# Altium schematic symbol library IC_ADI.SCHLIB: 3169 symbols (part 3 of 181)
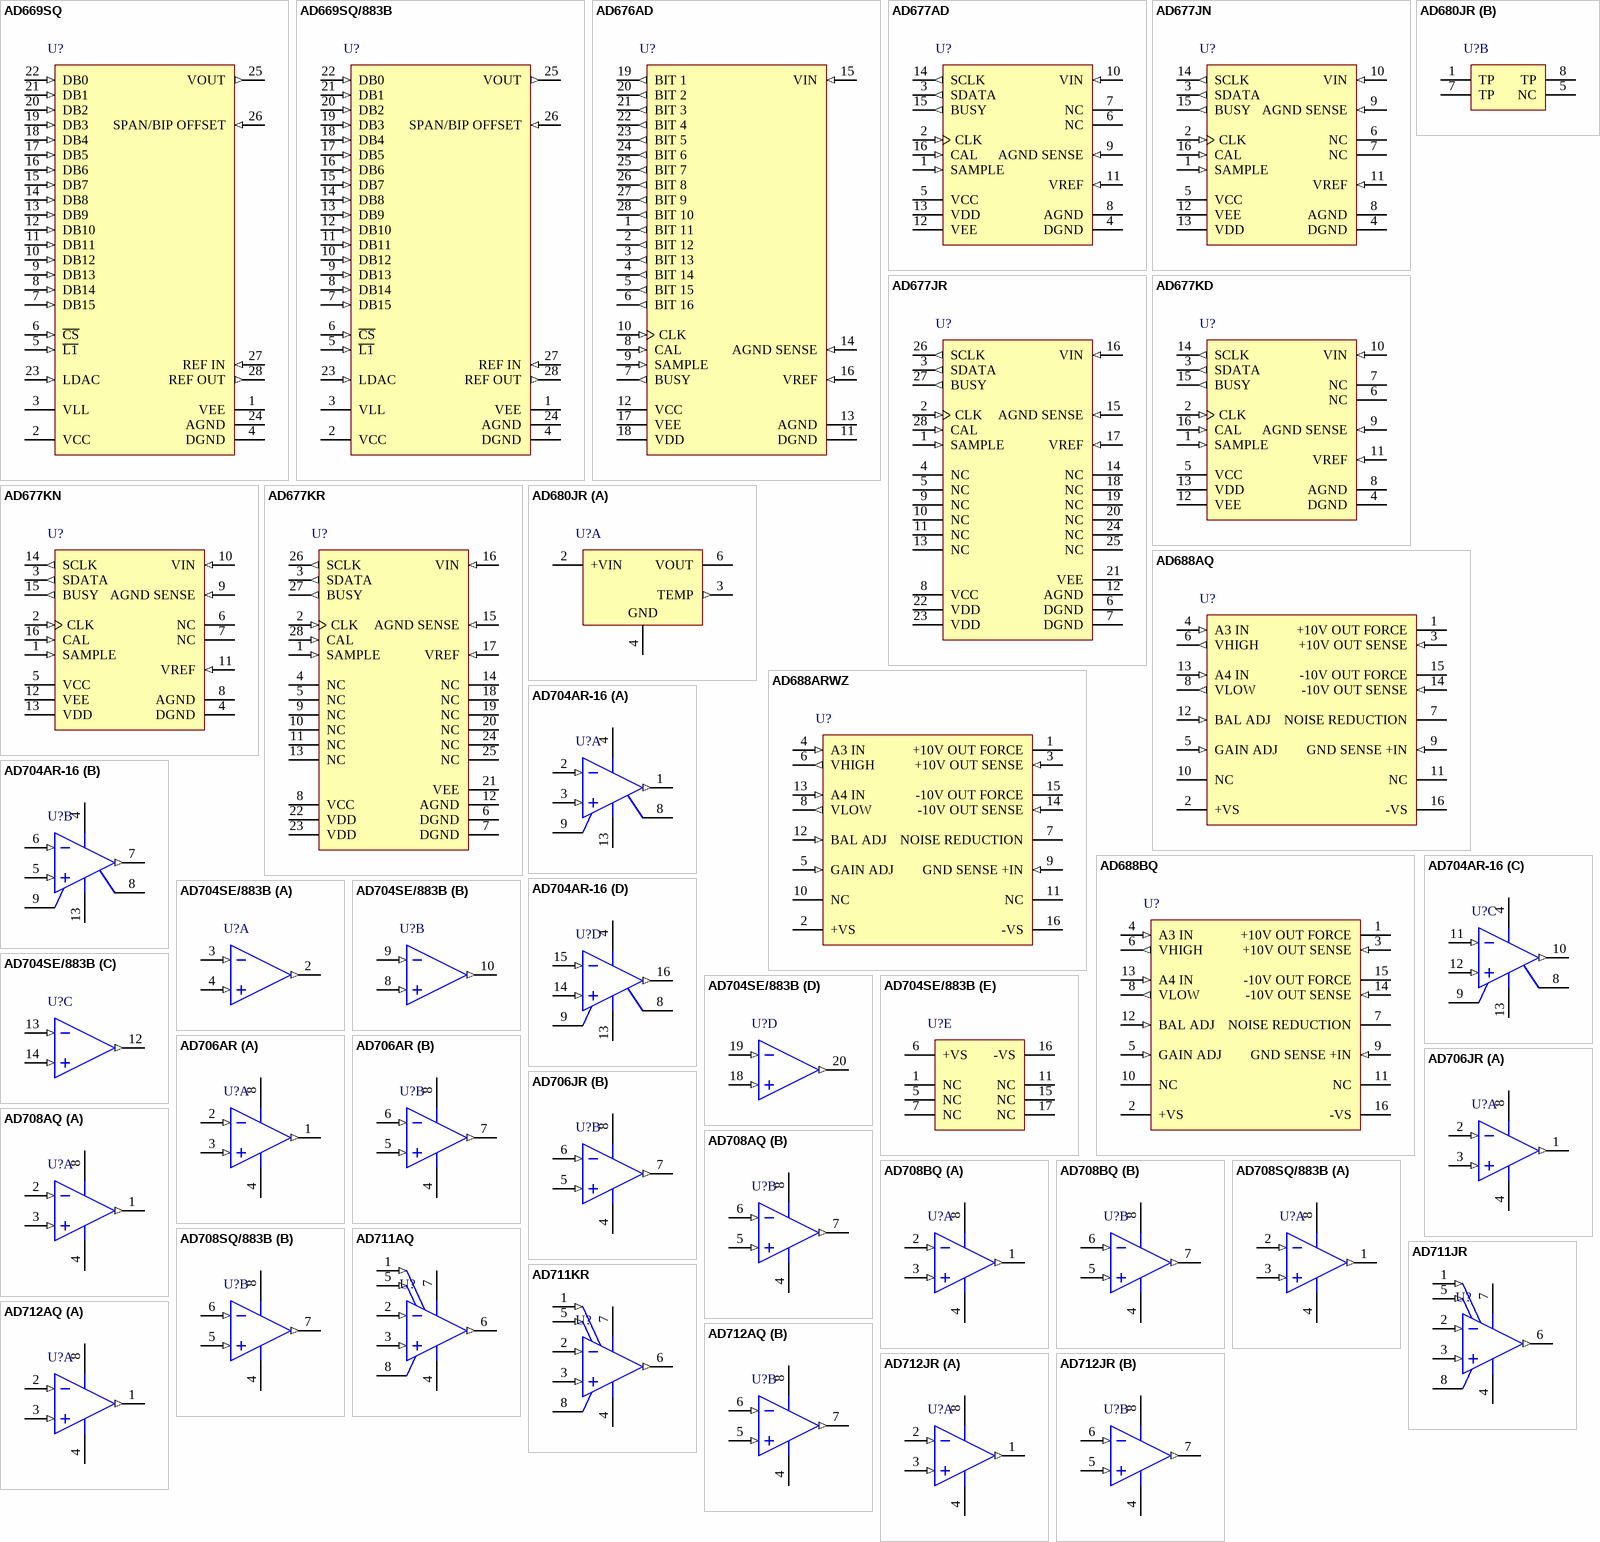
[diagram p193: symbols AD669SQ to AD712JR]

## AD677JR
designator U?
Single 16-Bit Sampling Analog-to-Digital Converter with Serial Interface, 100KSPS, 0 to +70 degC, RW-28, Tube; Generic Part Number: AD677; PartNumber: AD677JR; Resolution (Bits): 16; Channels: 1; Throughput Rate (SPS): 100K; Interface: Ser; DatasheetVersion: Rev.A; PackageVersion: 060706-A; PackageReference: RW-28; PackageDescription: 28-Lead Standard Small Outline Package [SOIC_W]; Supplier Part Number 1: AD677JR-ND; Supplier Part Number 2: 584-AD677JR; RoHS: N; Packing: Tube; Mounting Technology: Surface Mount; Code_JEDEC: MS-013-AE; ComponentLink1Description: Manufacturer URL; ComponentLink2Description: Datasheet; ComponentLink3Description: Package Specification; ComponentLink4Description: Product URL
footprint SOIC28W_1.27 (Footprint not found)
pins: 1 SAMPLE (in) "VIN Acquisition Control Pin. Active HIGH. During conversion, SAMPLEcontrols the suite of the internal sample-hold amplifier and the falling edgeinitiates conversion. During calibration, SAMPLE should be held LOW. IfHIGH (See Datasheet)", 2 CLK (in) "Master Clock Input. The AD677 requires 17 clock pulses to execute a conversion. CLK is also used to derive SCLK.", 3 SDATA (out) "Serial Output Data Controlled by SCLK.", 4 NC "No Connection. No connections should be made to these pins.", 5 NC "No Connection. No connections should be made to these pins.", 6 DGND (power) "Digital Ground.", 7 DGND (power) "Digital Ground.", 8 VCC (power) "+12 V Analog Supply Voltage.", 9 NC "No Connection. No connections should be made to these pins.", 10 NC "No Connection. No connections should be made to these pins.", 11 NC "No Connection. No connections should be made to these pins.", 12 AGND (power) "Analog Ground.", 13 NC "No Connection. No connections should be made to these pins.", 14 NC "No Connection. No connections should be made to these pins.", 15 AGND SENSE (in) "Analog Ground Sense.", 16 VIN (in) "Analog Input Voltage", 17 VREF (in) "External Voltage Reference Input.", 18 NC "No Connection. No connections should be made to these pins.", 19 NC "No Connection. No connections should be made to these pins.", 20 NC "No Connection. No connections should be made to these pins.", 21 VEE (power) "-12 V Analog Supply Voltage.", 22 VDD (power) "+5 V Logic Supply Voltage.", 23 VDD (power) "+5 V Logic Supply Voltage.", 24 NC "No Connection. No connections should be made to these pins.", 25 NC "No Connection. No connections should be made to these pins.", 26 SCLK (out) "Clock Output for Data Read, derived from CLK.", 27 BUSY (out) "Status Line for Converter. Active HIGH, indicating a conversion or calibration in progress.", 28 CAL (in) "Calibration Control Pin."

## AD677KD
designator U?
Single 16-Bit Sampling Analog-to-Digital Converter with Serial Interface, 100KSPS, 0 to +70 degC, D-16, Tube; Generic Part Number: AD677; PartNumber: AD677KD; Resolution (Bits): 16; Channels: 1; Throughput Rate (SPS): 100K; Interface: Ser; DatasheetVersion: Rev.A; PackageVersion: Oct-2004; PackageReference: D-16; PackageDescription: 16-Lead Side-Brazed Ceramic Dual In-Line Package [SBDIP]; Supplier Part Number 1: AD677KD-ND; Supplier Part Number 2: 584-AD677KD; RoHS: N; Packing: Tube; Mounting Technology: Through-hole; ComponentLink1Description: Manufacturer URL; ComponentLink2Description: Datasheet; ComponentLink3Description: Package Specification; ComponentLink4Description: Product URL
footprint DIP16 (Footprint not found)
pins: 1 SAMPLE (in) "VIN Acquisition Control Pin. Active HIGH. During conversion, SAMPLE controls the suite of the internal sample-hold amplifier and the falling edge initiates conversion. During calibration, SAMPLE should be held LOW. If HIGH (See Datasheet)", 2 CLK (in) "Master Clock Input. The AD677 requires 17 clock pulses to execute a conversion. CLK is also used to derive SCLK.", 3 SDATA (out) "Serial Output Data Controlled by SCLK.", 4 DGND (power) "Digital Ground.", 5 VCC (power) "+12 V Analog Supply Voltage.", 6 NC "No Connection. No connections should be made to these pins.", 7 NC "No Connection. No connections should be made to these pins.", 8 AGND (power) "Analog Ground.", 9 AGND SENSE (in) "Analog Ground Sense.", 10 VIN (in) "Analog Input Voltage.", 11 VREF (in) "External Voltage Reference Input.", 12 VEE (power) "-12 V Analog Supply Voltage.", 13 VDD (power) "+5 V Logic Supply Voltage.", 14 SCLK (out) "Clock Output for Data Read, derived from CLK.", 15 BUSY (out) "Status Line for Converter. Active HIGH, indicating a conversion or calibration in progress.", 16 CAL (in) "Calibration Control Pin."

## AD677KN
designator U?
Single 16-Bit Sampling Analog-to-Digital Converter with Serial Interface, 100KSPS, 0 to +70 degC, N-16, Tube; Generic Part Number: AD677; PartNumber: AD677KN; Resolution (Bits): 16; Channels: 1; Throughput Rate (SPS): 100K; Interface: Ser; DatasheetVersion: Rev.A; PackageVersion: 070706-A; PackageReference: N-16; PackageDescription: 16-Lead Plastic Dual In-Line Package [PDIP] Narrow Body; Supplier Part Number 1: AD677KN-ND; Supplier Part Number 2: 584-AD677KN; RoHS: N; Packing: Tube; Mounting Technology: Through-hole; Code_JEDEC: MS-001; ComponentLink1Description: Manufacturer URL; ComponentLink2Description: Datasheet; ComponentLink3Description: Package Specification; ComponentLink4Description: Product URL
footprint DIP16 (Footprint not found)
pins: 1 SAMPLE (in) "VIN  Acquisition Control Pin. Active HIGH. During conversion, SAMPLE controls the suite of the internal sample-hold amplifier and the falling edge initiates conversion. During calibration, SAMPLE should be held LOW. If HIGH (See Datasheet)", 2 CLK (in) "Master Clock Input. The AD677 requires 17 clock pulses to execute a conversion. CLK is also used to derive SCLK.", 3 SDATA (out) "Serial Output Data Controlled by SCLK.", 4 DGND (power) "Digital Ground.", 5 VCC (power) "+12 V Analog Supply Voltage.", 6 NC "No Connection. No connections should be made to these pins.", 7 NC "No Connection. No connections should be made to these pins.", 8 AGND (power) "Analog Ground.", 9 AGND SENSE (in) "Analog Ground Sense.", 10 VIN (in) "Analog Input Voltage.", 11 VREF (in) "External Voltage Reference Input.", 12 VEE (power) "-12 V Analog Supply Voltage.", 13 VDD (power) "+5 V Logic Supply Voltage.", 14 SCLK (out) "Clock Output for Data Read, derived from CLK.", 15 BUSY (out) "Status Line for Converter. Active HIGH, indicating a conversion or calibration in progress.", 16 CAL (in) "Calibration Control Pin."

## AD677KR
designator U?
Single 16-Bit Sampling Analog-to-Digital Converter with Serial Interface, 100KSPS, 0 to +70 degC, RW-28, Tube; Generic Part Number: AD677; PartNumber: AD677KR; Resolution (Bits): 16; Channels: 1; Throughput Rate (SPS): 100K; Interface: Ser; DatasheetVersion: Rev.A; PackageVersion: 060706-A; PackageReference: RW-28; PackageDescription: 28-Lead Standard Small Outline Package [SOIC_W]; Supplier Part Number 1: AD677KR-ND; Supplier Part Number 2: 584-AD677KR; RoHS: N; Packing: Tube; Mounting Technology: Surface Mount; Code_JEDEC: MS-013-AE; ComponentLink1Description: Manufacturer URL; ComponentLink2Description: Datasheet; ComponentLink3Description: Package Specification; ComponentLink4Description: Product URL
footprint SOIC28W_1.27 (Footprint not found)
pins: 1 SAMPLE (in) "VIN Acquisition Control Pin. Active HIGH. During conversion, SAMPLEcontrols the suite of the internal sample-hold amplifier and the falling edgeinitiates conversion. During calibration, SAMPLE should be held LOW. IfHIGH (See Datasheet)", 2 CLK (in) "Master Clock Input. The AD677 requires 17 clock pulses to execute a conversion. CLK is also used to derive SCLK.", 3 SDATA (out) "Serial Output Data Controlled by SCLK.", 4 NC "No Connection. No connections should be made to these pins.", 5 NC "No Connection. No connections should be made to these pins.", 6 DGND (power) "Digital Ground.", 7 DGND (power) "Digital Ground.", 8 VCC (power) "+12 V Analog Supply Voltage.", 9 NC "No Connection. No connections should be made to these pins.", 10 NC "No Connection. No connections should be made to these pins.", 11 NC "No Connection. No connections should be made to these pins.", 12 AGND (power) "Analog Ground.", 13 NC "No Connection. No connections should be made to these pins.", 14 NC "No Connection. No connections should be made to these pins.", 15 AGND SENSE (in) "Analog Ground Sense.", 16 VIN (in) "Analog Input Voltage", 17 VREF (in) "External Voltage Reference Input.", 18 NC "No Connection. No connections should be made to these pins.", 19 NC "No Connection. No connections should be made to these pins.", 20 NC "No Connection. No connections should be made to these pins.", 21 VEE (power) "-12 V Analog Supply Voltage.", 22 VDD (power) "+5 V Logic Supply Voltage.", 23 VDD (power) "+5 V Logic Supply Voltage.", 24 NC "No Connection. No connections should be made to these pins.", 25 NC "No Connection. No connections should be made to these pins.", 26 SCLK (out) "Clock Output for Data Read, derived from CLK.", 27 BUSY (out) "Status Line for Converter. Active HIGH, indicating a conversion or calibration in progress.", 28 CAL (in) "Calibration Control Pin."

## AD680JR
designator U?
Low Power, Low Cost Reference, 2.5 V Output, 4.5 to 36 V Supply, Commercial, 8-pin SOIC (R-8), Tube; PartNumber: AD680JR; Max V Supply (V): 36; Min V Supply (V): 4.5; Ref Out TC (ppm/C): 10; Vout: 2.5V; DatasheetVersion: Rev. H; PackageVersion: 060506-A, 06/2006; PackageReference: R-8; PackageDescription: 8-Pin Standard Small Outline Package, Body 4.9 x 3.9 mm, Pitch 1.27 mm; Supplier Part Number 1: AD680JR-ND; Supplier Part Number 2: 1017960; Supplier Part Number 3: N/A; Packing: Tube; Operating Temp Range: 0 to 70 degC; Mounting Technology: Surface Mount; Code_JEDEC: MS-012-AA; ComponentLink1Description: Manufacturer URL; ComponentLink2Description: Datasheet; ComponentLink3Description: Package Specification; ComponentLink4Description: URL Link1
footprint SOIC8_1.27 (Footprint not found)
part A pins: 2 +VIN (power) "Input Voltage.", 3 TEMP (out) "Temperature Output.", 4 GND (power) "Ground.", 6 VOUT (power) "Output Voltage."
part B pins: 1 TP "Test Point. A factory test point. No connections are made to these pins.", 5 NC "No Connect.", 7 TP "Test Point. A factory test point. No connections are made to these pins.", 8 TP "Test Point. A factory test point. No connections are made to these pins."

## AD688AQ
designator U?
High Precision Reference, 10 V Output, + / - 15 V Supply, Industrial, 16-pin DIP (Q-16), Tube; PartNumber: AD688AQ; Ref Out TC (ppm/C): 3; Vout: +/-10V; DatasheetVersion: Rev. B; PackageVersion: Aug-05; PackageReference: Q-16; PackageDescription: 16-Pin Ceramic Dual In-Line Package, Row spacing 7.62 mm, Pitch 2.54 mm; Supplier Part Number 1: AD688AQ-ND; Supplier Part Number 2: 2190205; Supplier Part Number 3: 584-AD688AQ; Packing: Tube; Operating Temp Range: -40 to 85 degC; Mounting Technology: Through Hole; ComponentLink1Description: Manufacturer URL; ComponentLink2Description: Datasheet; ComponentLink3Description: Package Specification; ComponentLink4Description: URL Link1
footprint DIP16 (Footprint not found)
pins: 1 +10V OUT FORCE (power) "+10 V Output with Kelvin Force. Connect to Pin 3.", 2 +VS (power) "Positive Power Supply.", 3 +10V OUT SENSE (in) "+10 V Output with Kelvin Sense. Connect to Pin 1.", 4 A3 IN (in) "+ Input to A3. Connect to VHIGH, Pin 6.", 5 GAIN ADJ (in) "Reference Gain Adjustment for Calibration. See the Calibration section.", 6 VHIGH (out) "Unbuffered Reference High Output.", 7 NOISE REDUCTION "Noise Filtering Pin. Connect external 1 uF capacitor to ground to reduce output noise, see the Noise Performance and Reduction section. May be left open.", 8 VLOW (out) "Unbuffered Reference Low Output.", 9 GND SENSE +IN (in) "Gound with Kelvin Sense.", 10 NC "No Connection. Leave floating.", 11 NC "No Connection. Leave floating.", 12 BAL ADJ (in) "Reference Centering Adjustment for Calibration. See the Calibration section.", 13 A4 IN (in) "+ Input to A4. Connect to VLOW, Pin 8.", 14 -10V OUT SENSE (in) "-10 V Output with Kelvin Sense. Connect to Pin 15.", 15 -10V OUT FORCE (power) "-10 V Output with Kelvin Force. Connect to Pin 14.", 16 -VS (power) "Negative Power Supply."

## AD688ARWZ
designator U?
High Precision Reference, 10 V Output, + / - 15 V Supply, Industrial, 16-pin SOIC (RW-16), Tube; PartNumber: AD688ARWZ; Ref Out TC (ppm/C): 8; Vout: +/-10V; DatasheetVersion: Rev. B; PackageVersion: 032707-B, 03/2007; PackageReference: RW-16; PackageDescription: 16-Pin Standard Small Outline Package, Body 10.3 x 7.5 mm, Pitch 1.27 mm; Supplier Part Number 1: AD688ARWZ-ND; Supplier Part Number 2: 1838918; Supplier Part Number 3: 584-AD688ARWZ; Packing: Tube; Operating Temp Range: -40 to 85 degC; Mounting Technology: Surface Mount; Code_JEDEC: MS-013-AA; ComponentLink1Description: Manufacturer URL; ComponentLink2Description: Datasheet; ComponentLink3Description: Package Specification; ComponentLink4Description: URL Link1
footprint SOIC16W_1.27 (Footprint not found)
pins: 1 +10V OUT FORCE (power) "+10 V Output with Kelvin Force. Connect to Pin 3.", 2 +VS (power) "Positive Power Supply.", 3 +10V OUT SENSE (in) "+10 V Output with Kelvin Sense. Connect to Pin 1.", 4 A3 IN (in) "+ Input to A3. Connect to VHIGH, Pin 6.", 5 GAIN ADJ (in) "Reference Gain Adjustment for Calibration. See the Calibration section.", 6 VHIGH (out) "Unbuffered Reference High Output.", 7 NOISE REDUCTION "Noise Filtering Pin. Connect external 1 uF capacitor to ground to reduce output noise, see the Noise Performance and Reduction section. May be left open.", 8 VLOW (out) "Unbuffered Reference Low Output.", 9 GND SENSE +IN (in) "Gound with Kelvin Sense.", 10 NC "No Connection. Leave floating.", 11 NC "No Connection. Leave floating.", 12 BAL ADJ (in) "Reference Centering Adjustment for Calibration. See the Calibration section.", 13 A4 IN (in) "+ Input to A4. Connect to VLOW, Pin 8.", 14 -10V OUT SENSE (in) "-10 V Output with Kelvin Sense. Connect to Pin 15.", 15 -10V OUT FORCE (power) "-10 V Output with Kelvin Force. Connect to Pin 14.", 16 -VS (power) "Negative Power Supply."

## AD688BQ
designator U?
High Precision Reference, 10 V Output, + / - 15 V Supply, Industrial, 16-pin DIP (Q-16), Tube; PartNumber: AD688BQ; Ref Out TC (ppm/C): 3; Vout: +/-10V; DatasheetVersion: Rev. B; PackageVersion: Aug-05; PackageReference: Q-16; PackageDescription: 16-Pin Ceramic Dual In-Line Package, Row spacing 7.62 mm, Pitch 2.54 mm; Supplier Part Number 1: AD688BQ-ND; Supplier Part Number 2: 584-AD688BQ; Packing: Tube; Operating Temp Range: -40 to 85 degC; Mounting Technology: Through Hole; ComponentLink1Description: Manufacturer URL; ComponentLink2Description: Datasheet; ComponentLink3Description: Package Specification; ComponentLink4Description: URL Link1
footprint DIP16 (Footprint not found)
pins: 1 +10V OUT FORCE (power) "+10 V Output with Kelvin Force. Connect to Pin 3.", 2 +VS (power) "Positive Power Supply.", 3 +10V OUT SENSE (in) "+10 V Output with Kelvin Sense. Connect to Pin 1.", 4 A3 IN (in) "+ Input to A3. Connect to VHIGH, Pin 6.", 5 GAIN ADJ (in) "Reference Gain Adjustment for Calibration. See the Calibration section.", 6 VHIGH (out) "Unbuffered Reference High Output.", 7 NOISE REDUCTION "Noise Filtering Pin. Connect external 1 uF capacitor to ground to reduce output noise, see the Noise Performance and Reduction section. May be left open.", 8 VLOW (out) "Unbuffered Reference Low Output.", 9 GND SENSE +IN (in) "Gound with Kelvin Sense.", 10 NC "No Connection. Leave floating.", 11 NC "No Connection. Leave floating.", 12 BAL ADJ (in) "Reference Centering Adjustment for Calibration. See the Calibration section.", 13 A4 IN (in) "+ Input to A4. Connect to VLOW, Pin 8.", 14 -10V OUT SENSE (in) "-10 V Output with Kelvin Sense. Connect to Pin 15.", 15 -10V OUT FORCE (power) "-10 V Output with Kelvin Force. Connect to Pin 14.", 16 -VS (power) "Negative Power Supply."

## AD704AR-16
designator U?
Quad Channel Low Power Operational Amplifier, 800 KHz BW, 150 mV/us SR, Industrial, 16-pin SOIC (RW-16), Tube; Generic Part Number: AD704; PartNumber: AD704AR-16; Amplifiers Per Package: 4; Input Bias Current: 100pA; Input Offset Voltage: 30uV; Iq/Amp: 600uA; Small Signal Bandwidth: 800KHz; V Span Max: 36V; V Span Min: 4V; DatasheetVersion: Rev. E; PackageVersion: 032707-B; PackageReference: RW-16; PackageDescription: 16-Pin Standard Small Outline Package, Body 10.3 x 7.5 mm, Pitch 1.27 mm; Supplier Part Number 1: AD704AR-16-ND; Supplier Part Number 2: 66F5820; Packing: Tube; Slew Rate: 150mV/us; Mounting Technology: Surface Mount; Code_JEDEC: MS-013-AA; ComponentLink1Description: Manufacturer URL; ComponentLink2Description: Datasheet; ComponentLink3Description: Package Specification
footprint SOIC16W_1.27 (Footprint not found)
pins on every part: 4 +VS (power), 8 NC, 9 NC, 13 -VS (power)
part A pins: 1 OUT 1 (out), 2 -IN 1 (in), 3 +IN 1 (in)
part B pins: 5 +IN 2 (in), 6 -IN 2 (in), 7 OUT 2 (out)
part C pins: 10 OUT 3 (out), 11 -IN 3 (in), 12 +IN 3 (in)
part D pins: 14 +IN 4 (in), 15 -IN 4 (in), 16 OUT 4 (out)

## AD704SE/883B
designator U?
Quad Channel Low Power Operational Amplifier, 800 KHz BW, 150 mV/us SR, Military, 20-pin LCC (E-20-1), Tube; Generic Part Number: AD704; PartNumber: AD704SE/883B; Amplifiers Per Package: 4; Input Bias Current: 100pA; Input Offset Voltage: 30uV; Iq/Amp: 600uA; Small Signal Bandwidth: 800KHz; V Span Max: 36V; V Span Min: 4V; DatasheetVersion: Rev. E; PackageVersion: 022106-A; PackageReference: E-20-1; PackageDescription: 20-Terminal Ceramic Leadless Chip Carrier, Body 8.89 x 8.89 mm, Pitch 1.27 mm; Supplier Part Number 1: AD704SE/883B-ND; Packing: Tube; Slew Rate: 150mV/us; Mounting Technology: Surface Mount; ComponentLink1Description: Manufacturer URL; ComponentLink2Description: Datasheet; ComponentLink3Description: Package Specification
footprint PLCC-20N (Footprint not found)
part A pins: 2 OUT 1 (out), 3 -IN 1 (in), 4 +IN 1 (in)
part B pins: 8 +IN 2 (in), 9 -IN 2 (in), 10 OUT 2 (out)
part C pins: 12 OUT 3 (out), 13 -IN 3 (in), 14 +IN 3 (in)
part D pins: 18 +IN 4 (in), 19 -IN 4 (in), 20 OUT 4 (out)
part E pins: 1 NC, 5 NC, 6 +VS (power), 7 NC, 11 NC, 15 NC, 16 -VS (power), 17 NC

## AD706AR
designator U?
Double Channel High DC Precision Operational Amplifier, 800 KHz BW, 150 mV/us SR, Industrial, 8-pin SOIC (R-8), Tube; Generic Part Number: AD706; PartNumber: AD706AR; Amplifiers Per Package: 2; Input Bias Current: 50pA; Input Offset Voltage: 30uV; Iq/Amp: 600uA; Small Signal Bandwidth: 800KHz; V Span Max: 36V; V Span Min: 4V; DatasheetVersion: Rev. E; PackageVersion: 060506-A; PackageReference: R-8; PackageDescription: 8-Pin Standard Small Outline Package, Body 3.9 x 4.9 mm, Pitch 1.27 mm; Supplier Part Number 1: AD706AR-ND; Packing: Tube; Slew Rate: 150mV/us; Mounting Technology: Surface Mount; Code_JEDEC: MS-012-AA; ComponentLink1Description: Manufacturer URL; ComponentLink2Description: Datasheet; ComponentLink3Description: Package Specification
footprint SOIC8_1.27 (Footprint not found)
pins on every part: 4 -V (power), 8 +V (power)
part A pins: 1 OUT (out), 2 -IN (in), 3 +IN (in)
part B pins: 5 +IN (in), 6 -IN (in), 7 OUT (out)

## AD706JR
designator U?
Double Channel High DC Precision Operational Amplifier, 800 KHz BW, 150 mV/us SR, Commercial, 8-pin SOIC (R-8), Tube; Generic Part Number: AD706; PartNumber: AD706JR; Amplifiers Per Package: 2; Input Bias Current: 50pA; Input Offset Voltage: 30uV; Iq/Amp: 600uA; Small Signal Bandwidth: 800KHz; V Span Max: 36V; V Span Min: 4V; DatasheetVersion: Rev. E; PackageVersion: 060506-A; PackageReference: R-8; PackageDescription: 8-Pin Standard Small Outline Package, Body 3.9 x 4.9 mm, Pitch 1.27 mm; Supplier Part Number 1: AD706JR-ND; Packing: Tube; Slew Rate: 150mV/us; Mounting Technology: Surface Mount; Code_JEDEC: MS-012-AA; ComponentLink1Description: Manufacturer URL; ComponentLink2Description: Datasheet; ComponentLink3Description: Package Specification
footprint SOIC8_1.27 (Footprint not found)
pins on every part: 4 -V (power), 8 +V (power)
part A pins: 1 OUT (out), 2 -IN (in), 3 +IN (in)
part B pins: 5 +IN (in), 6 -IN (in), 7 OUT (out)

## AD708AQ
designator U?
Double Channel Very High DC Precision Operational Amplifier, 900KHz BW, 300 mV/us SR, Industrial, 8-pin DIP (Q-8), Tube; Generic Part Number: AD708; PartNumber: AD708AQ; Amplifiers Per Package: 2; Input Bias Current: 1nA; Input Offset Voltage: 30uV; Iq/Amp: 2.75mA; V Span Max: 36V; V Span Min: 6V; DatasheetVersion: Rev. C; PackageReference: Q-8; PackageDescription: 8-Pin Ceramic Dual In-Line Package, Row spacing 7.62 mm, Pitch 2.54 mm; Supplier Part Number 1: AD708AQ-ND; Supplier Part Number 2: 2231864; Supplier Part Number 3: 05F7250; Packing: Tube; Slew Rate: 300mV/us; Small Signal Bandwidth: 900KHz; Mounting Technology: Through Hole; ComponentLink1Description: Manufacturer URL; ComponentLink2Description: Datasheet; ComponentLink3Description: Package Specification
footprint DIP8 (Footprint not found)
pins on every part: 4 -VS (power), 8 +VS (power)
part A pins: 1 OUT A (out), 2 -IN A (in), 3 +IN A (in)
part B pins: 5 +IN B (in), 6 -IN B (in), 7 OUT B (out)

## AD708BQ
designator U?
Double Channel Very High DC Precision Operational Amplifier, 900KHz BW, 300 mV/us SR, Industrial, 8-pin DIP (Q-8), Tube; Generic Part Number: AD708; PartNumber: AD708BQ; Amplifiers Per Package: 2; Input Bias Current: 0.5nA; Input Offset Voltage: 5uV; Iq/Amp: 2.75mA; V Span Max: 36V; V Span Min: 6V; DatasheetVersion: Rev. C; PackageReference: Q-8; PackageDescription: 8-Pin Ceramic Dual In-Line Package, Row spacing 7.62 mm, Pitch 2.54 mm; Supplier Part Number 1: AD708BQ-ND; Supplier Part Number 2: 05F7251; Packing: Tube; Slew Rate: 300mV/us; Small Signal Bandwidth: 900KHz; Mounting Technology: Through Hole; ComponentLink1Description: Manufacturer URL; ComponentLink2Description: Datasheet; ComponentLink3Description: Package Specification
footprint DIP8 (Footprint not found)
pins on every part: 4 -VS (power), 8 +VS (power)
part A pins: 1 OUT A (out), 2 -IN A (in), 3 +IN A (in)
part B pins: 5 +IN B (in), 6 -IN B (in), 7 OUT B (out)

## AD708SQ/883B
designator U?
Double Channel Very High DC Precision Operational Amplifier, 900KHz BW, 300 mV/us SR, Military, 8-pin DIP (Q-8), Tube; Generic Part Number: AD708; PartNumber: AD708SQ/883B; Amplifiers Per Package: 2; Input Bias Current: 0.5nA; Input Offset Voltage: 5uV; Iq/Amp: 2.75mA; V Span Max: 36V; V Span Min: 6V; DatasheetVersion: Rev. C; PackageReference: Q-8; PackageDescription: 8-Pin Ceramic Dual In-Line Package, Row spacing 7.62 mm, Pitch 2.54 mm; Supplier Part Number 1: AD708SQ/883B-ND; Packing: Tube; Slew Rate: 300mV/us; Small Signal Bandwidth: 900KHz; Mounting Technology: Through Hole; ComponentLink1Description: Manufacturer URL; ComponentLink2Description: Datasheet; ComponentLink3Description: Package Specification
footprint DIP8 (Footprint not found)
pins on every part: 4 -VS (power), 8 +VS (power)
part A pins: 1 OUT A (out), 2 -IN A (in), 3 +IN A (in)
part B pins: 5 +IN B (in), 6 -IN B (in), 7 OUT B (out)

## AD711AQ
designator U?
Single Channel Operational Amplifier, 4 MHz BW, 20 V/us SR, Industrial, 8-pin DIP (Q-8), Tube; Generic Part Number: AD711; PartNumber: AD711AQ; Amplifiers Per Package: 1; Input Bias Current: 15pA; Input Offset Voltage: 300uV; Iq/Amp: 2.8mA; Slew Rate: 20V/us; Small Signal Bandwidth: 4MHz; V Span Max: 36V; V Span Min: 9V; DatasheetVersion: Rev. E; PackageReference: Q-8; PackageDescription: 8-Pin Ceramic Dual In-Line Package, Row spacing 7.62 mm, Pitch 2.54 mm; Supplier Part Number 1: AD711AQ-ND; Supplier Part Number 2: 05F7255; Packing: Tube; Mounting Technology: Through Hole; ComponentLink1Description: Manufacturer URL; ComponentLink2Description: Datasheet; ComponentLink3Description: Package Specification
footprint DIP8 (Footprint not found)
pins: 1 OFFSET NULL (in), 2 INVERTING INPUT (in), 3 NONINVERTING INPUT (in), 4 -VS (power), 5 OFFSET NULL (in), 6 OUT (out), 7 +VS (power), 8 NC

## AD711JR
designator U?
Single Channel Operational Amplifier, 4 MHz BW, 20 V/us SR, Commercial, 8-pin SOIC (R-8), Tube; Generic Part Number: AD711; PartNumber: AD711JR; Amplifiers Per Package: 1; Input Bias Current: 15pA; Input Offset Voltage: 300uV; Iq/Amp: 2.8mA; Slew Rate: 20V/us; Small Signal Bandwidth: 4MHz; V Span Max: 36V; V Span Min: 9V; DatasheetVersion: Rev. E; PackageVersion: 060506-A; PackageReference: R-8; PackageDescription: 8-Pin Standard Small Outline Package, Body 3.9 x 4.9 mm, Pitch 1.27 mm; Supplier Part Number 1: AD711JR-ND; Packing: Tube; Mounting Technology: Surface Mount; Code_JEDEC: MS-012-AA; ComponentLink1Description: Manufacturer URL; ComponentLink2Description: Datasheet; ComponentLink3Description: Package Specification
footprint SOIC8_1.27 (Footprint not found)
pins: 1 OFFSET NULL (in), 2 INVERTING INPUT (in), 3 NONINVERTING INPUT (in), 4 -VS (power), 5 OFFSET NULL (in), 6 OUT (out), 7 +VS (power), 8 NC

## AD711KR
designator U?
Single Channel Operational Amplifier, 4 MHz BW, 20 V/us SR, Commercial, 8-pin SOIC (R-8), Tube; Generic Part Number: AD711; PartNumber: AD711KR; Amplifiers Per Package: 1; Input Bias Current: 15pA; Input Offset Voltage: 200uV; Iq/Amp: 2.8mA; Slew Rate: 20V/us; Small Signal Bandwidth: 4MHz; V Span Max: 36V; V Span Min: 9V; DatasheetVersion: Rev. E; PackageVersion: 060506-A; PackageReference: R-8; PackageDescription: 8-Pin Standard Small Outline Package, Body 3.9 x 4.9 mm, Pitch 1.27 mm; Supplier Part Number 1: AD711KR-ND; Packing: Tube; Mounting Technology: Surface Mount; Code_JEDEC: MS-012-AA; ComponentLink1Description: Manufacturer URL; ComponentLink2Description: Datasheet; ComponentLink3Description: Package Specification
footprint SOIC8_1.27 (Footprint not found)
pins: 1 OFFSET NULL (in), 2 INVERTING INPUT (in), 3 NONINVERTING INPUT (in), 4 -VS (power), 5 OFFSET NULL (in), 6 OUT (out), 7 +VS (power), 8 NC

## AD712AQ
designator U?
Double Channel Operational Amplifier, 4 MHz BW, 20 V/us SR, Industrial, 8-pin DIP (Q-8), Tube; Generic Part Number: AD712; PartNumber: AD712AQ; Amplifiers Per Package: 2; Input Bias Current: 25pA; Input Offset Voltage: 300uV; Iq/Amp: 2.8mA; Slew Rate: 20V/us; Small Signal Bandwidth: 4MHz; V Span Max: 36V; V Span Min: 9V; DatasheetVersion: Rev. H; PackageReference: Q-8; PackageDescription: 8-Pin Ceramic Dual In-Line Package, Row spacing 7.62 mm, Pitch 2.54 mm; Supplier Part Number 1: AD712AQ-ND; Supplier Part Number 2: 05F7274; Packing: Tube; Mounting Technology: Through Hole; ComponentLink1Description: Manufacturer URL; ComponentLink2Description: Datasheet; ComponentLink3Description: Package Specification
footprint DIP8 (Footprint not found)
pins on every part: 4 -V (power), 8 +V (power)
part A pins: 1 OUT (out), 2 INVERTING INPUT (in), 3 NONINVERTING INPUT (in)
part B pins: 5 NONINVERTING INPUT (in), 6 INVERTING INPUT (in), 7 OUT (out)

## AD712JR
designator U?
Double Channel Operational Amplifier, 4 MHz BW, 20 V/us SR, Commercial, 8-pin SOIC (R-8), Tube; Generic Part Number: AD712; PartNumber: AD712JR; Amplifiers Per Package: 2; Input Bias Current: 25pA; Input Offset Voltage: 300uV; Iq/Amp: 2.8mA; Slew Rate: 20V/us; Small Signal Bandwidth: 4MHz; V Span Max: 36V; V Span Min: 9V; DatasheetVersion: Rev. H; PackageVersion: 060506-A; PackageReference: R-8; PackageDescription: 8-Pin Standard Small Outline Package, Body 3.9 x 4.9 mm, Pitch 1.27 mm; Supplier Part Number 1: AD712JR-ND; Packing: Tube; Mounting Technology: Surface Mount; Code_JEDEC: MS-012-AA; ComponentLink1Description: Manufacturer URL; ComponentLink2Description: Datasheet; ComponentLink3Description: Package Specification
footprint SOIC8_1.27 (Footprint not found)
pins on every part: 4 -V (power), 8 +V (power)
part A pins: 1 OUT (out), 2 INVERTING INPUT (in), 3 NONINVERTING INPUT (in)
part B pins: 5 NONINVERTING INPUT (in), 6 INVERTING INPUT (in), 7 OUT (out)

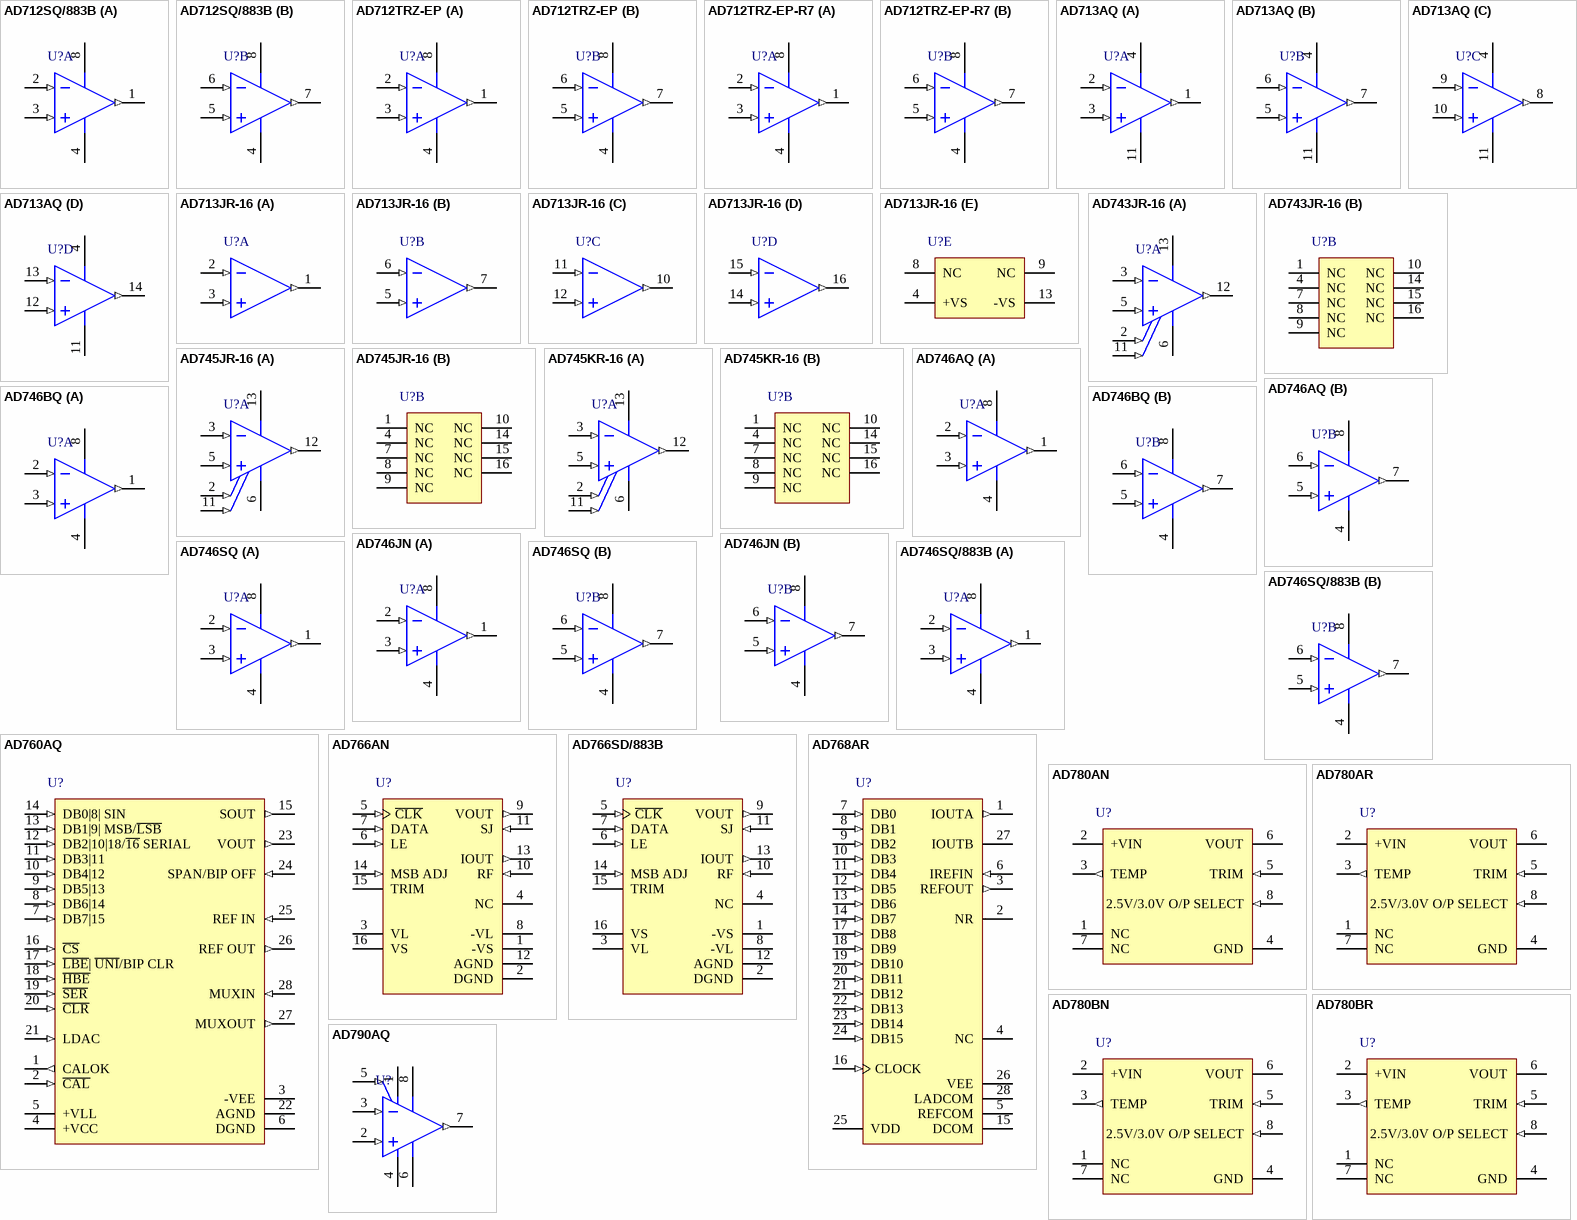
[diagram p5: symbols AD712SQ/883B to AD790AQ]

## AD712SQ/883B
designator U?
Double Channel Operational Amplifier, 4 MHz BW, 20 V/us SR, Military, 8-pin DIP (Q-8), Tube; Generic Part Number: AD712; PartNumber: AD712SQ/883B; Amplifiers Per Package: 2; Input Bias Current: 25pA; Input Offset Voltage: 300uV; Iq/Amp: 2.8mA; Slew Rate: 20V/us; Small Signal Bandwidth: 4MHz; V Span Max: 36V; V Span Min: 9V; DatasheetVersion: Rev. H; PackageReference: Q-8; PackageDescription: 8-Pin Ceramic Dual In-Line Package, Row spacing 7.62 mm, Pitch 2.54 mm; Supplier Part Number 1: AD712SQ/883B-ND; Supplier Part Number 2: 28M3230; Packing: Tube; Mounting Technology: Through Hole; ComponentLink1Description: Manufacturer URL; ComponentLink2Description: Datasheet; ComponentLink3Description: Package Specification
footprint DIP8 (Footprint not found)
pins on every part: 4 -V (power), 8 +V (power)
part A pins: 1 OUT (out), 2 INVERTING INPUT (in), 3 NONINVERTING INPUT (in)
part B pins: 5 NONINVERTING INPUT (in), 6 INVERTING INPUT (in), 7 OUT (out)

## AD712TRZ-EP
designator U?
Double Channel Operational Amplifier, 4 MHz BW, 20 V/us SR, Military, 8-pin SOIC (R-8), Tube; Generic Part Number: AD712; PartNumber: AD712TRZ-EP; Amplifiers Per Package: 2; Input Bias Current: 25pA; Input Offset Voltage: 300uV; Iq/Amp: 2.8mA; Slew Rate: 20V/us; Small Signal Bandwidth: 4MHz; V Span Max: 36V; V Span Min: 9V; DatasheetVersion: Rev. H; PackageVersion: 060506-A; PackageReference: R-8; PackageDescription: 8-Pin Standard Small Outline Package, Body 3.9 x 4.9 mm, Pitch 1.27 mm; Supplier Part Number 1: AD712TRZ-EP-ND; Supplier Part Number 2: 85R6433; Packing: Tube; Mounting Technology: Surface Mount; Code_JEDEC: MS-012-AA; ComponentLink1Description: Manufacturer URL; ComponentLink2Description: Datasheet; ComponentLink3Description: Package Specification
footprint SOIC8_1.27 (Footprint not found)
pins on every part: 4 -V (power), 8 +V (power)
part A pins: 1 OUT (out), 2 INVERTING INPUT (in), 3 NONINVERTING INPUT (in)
part B pins: 5 NONINVERTING INPUT (in), 6 INVERTING INPUT (in), 7 OUT (out)

## AD712TRZ-EP-R7
designator U?
Double Channel Operational Amplifier, 4 MHz BW, 20 V/us SR, Military, 8-pin SOIC (R-8), Reel; Generic Part Number: AD712; PartNumber: AD712TRZ-EP-R7; Amplifiers Per Package: 2; Input Bias Current: 25pA; Input Offset Voltage: 300uV; Iq/Amp: 2.8mA; Slew Rate: 20V/us; Small Signal Bandwidth: 4MHz; V Span Max: 36V; V Span Min: 9V; DatasheetVersion: Rev. H; PackageVersion: 060506-A; PackageReference: R-8; PackageDescription: 8-Pin Standard Small Outline Package, Body 3.9 x 4.9 mm, Pitch 1.27 mm; Supplier Part Number 1: AD712TRZ-EP-R7TR-ND; Supplier Part Number 2: AD712TRZ-EP-R7CT-ND; Supplier Part Number 3: AD712TRZ-EP-R7DKR-ND; Supplier Part Number 4: 85R6434; Packing: Reel; Mounting Technology: Surface Mount; Code_JEDEC: MS-012-AA; ComponentLink1Description: Manufacturer URL; ComponentLink2Description: Datasheet; ComponentLink3Description: Package Specification
footprint SOIC8_1.27 (Footprint not found)
pins on every part: 4 -V (power), 8 +V (power)
part A pins: 1 OUT (out), 2 INVERTING INPUT (in), 3 NONINVERTING INPUT (in)
part B pins: 5 NONINVERTING INPUT (in), 6 INVERTING INPUT (in), 7 OUT (out)

## AD713AQ
designator U?
Quad Channel Operational Amplifier, 4 MHz BW, 20 V/us SR, Industrial, 14-pin DIP (Q-14), Tube; Generic Part Number: AD713; PartNumber: AD713AQ; Amplifiers Per Package: 4; Input Bias Current: 40pA; Input Offset Voltage: 300uV; Iq/Amp: 3mA; Slew Rate: 20V/us; Small Signal Bandwidth: 4MHz; V Span Max: 36V; V Span Min: 9V; DatasheetVersion: Rev. F; PackageReference: Q-14; PackageDescription: 14-Pin Ceramic Dual In-Line Package, Row spacing 7.62 mm, Pitch 2.54 mm; Supplier Part Number 1: AD713AQ-ND; Supplier Part Number 2: 1646254; Supplier Part Number 3: 66F5831; Packing: Tube; Mounting Technology: Through Hole; ComponentLink1Description: Manufacturer URL; ComponentLink2Description: Datasheet; ComponentLink3Description: Package Specification
footprint DIP14 (Footprint not found)
pins on every part: 4 +VS (power), 11 -VS (power)
part A pins: 1 OUT 1 (out), 2 -IN 1 (in), 3 +IN 1 (in)
part B pins: 5 +IN 2 (in), 6 -IN 2 (in), 7 OUT 2 (out)
part C pins: 8 OUT 3 (out), 9 -IN 3 (in), 10 +IN 3 (in)
part D pins: 12 +IN 4 (in), 13 -IN 4 (in), 14 OUT 4 (out)

## AD713JR-16
designator U?
Quad Channel Operational Amplifier, 4 MHz BW, 20 V/us SR, Commercial, 16-pin SOIC (RW-16), Tube; Generic Part Number: AD713; PartNumber: AD713JR-16; Amplifiers Per Package: 4; Input Bias Current: 40pA; Input Offset Voltage: 300uV; Iq/Amp: 3mA; Slew Rate: 20V/us; Small Signal Bandwidth: 4MHz; V Span Max: 36V; V Span Min: 9V; DatasheetVersion: Rev. F; PackageVersion: 032707-B; PackageReference: RW-16; PackageDescription: 16-Pin Standard Small Outline Package, Body 10.3 x 7.5 mm, Pitch 1.27 mm; Supplier Part Number 1: AD713JR-16-ND; Packing: Tube; Mounting Technology: Surface Mount; Code_JEDEC: MS-013-AA; ComponentLink1Description: Manufacturer URL; ComponentLink2Description: Datasheet; ComponentLink3Description: Package Specification
footprint SOIC16W_1.27 (Footprint not found)
part A pins: 1 OUT (out), 2 -IN (in), 3 +IN (in)
part B pins: 5 +IN (in), 6 -IN (in), 7 OUT (out)
part C pins: 10 OUT (out), 11 -IN (in), 12 +IN (in)
part D pins: 14 +IN (in), 15 -IN (in), 16 OUT (out)
part E pins: 4 +VS (power), 8 NC, 9 NC, 13 -VS (power)

## AD743JR-16
designator U?
Single Channel Ultralow Noise Performance Operational Amplifier, 4.5 MHz BW, 2.8 V/us SR, Commercial, 16-pin SOIC (RW-16), Tube; Generic Part Number: AD743; PartNumber: AD743JR-16; Amplifiers Per Package: 1; Input Bias Current: 150pA; Input Offset Voltage: 250uV; Iq/Amp: 10mA; Small Signal Bandwidth: 4.5MHz; V Span Max: 36V; V Span Min: 9.6V; DatasheetVersion: Rev. E; PackageVersion: 032707-B; PackageReference: RW-16; PackageDescription: 16-Pin Standard Small Outline Package, Body 10.3 x 7.5 mm, Pitch 1.27 mm; Supplier Part Number 1: AD743JR-16-ND; Supplier Part Number 2: 73C9410; Packing: Tube; Slew Rate: 2.8V/us; Mounting Technology: Surface Mount; Code_JEDEC: MS-013-AA; ComponentLink1Description: Manufacturer URL; ComponentLink2Description: Datasheet; ComponentLink3Description: Package Specification
footprint SOIC16W_1.27 (Footprint not found)
part A pins: 2 OFFSET NULL (in), 3 -IN (in), 5 +IN (in), 6 -VS (power), 11 OFFSET NULL (in), 12 OUT (out), 13 +VS (power)
part B pins: 1 NC, 4 NC, 7 NC, 8 NC, 9 NC, 10 NC, 14 NC, 15 NC, 16 NC

## AD745JR-16
designator U?
Single Channel Ultralow Noise Performance Operational Amplifier, 20 MHz BW, 12.5 V/us SR, Commercial, 16-pin SOIC (RW-16), Tube; Generic Part Number: AD745; PartNumber: AD745JR-16; Amplifiers Per Package: 1; Input Bias Current: 150pA; Input Offset Voltage: 250uV; Iq/Amp: 10mA; Small Signal Bandwidth: 20MHz; V Span Max: 36V; V Span Min: 9.6V; DatasheetVersion: Rev. D; PackageVersion: 032707-B; PackageReference: RW-16; PackageDescription: 16-Pin Standard Small Outline Package, Body 10.3 x 7.5 mm, Pitch 1.27 mm; Supplier Part Number 1: AD745JR-16-ND; Supplier Part Number 2: 1464559; Supplier Part Number 3: 66F5841; Packing: Tube; Slew Rate: 12.5V/us; Mounting Technology: Surface Mount; Code_JEDEC: MS-013-AA; ComponentLink1Description: Manufacturer URL; ComponentLink2Description: Datasheet; ComponentLink3Description: Package Specification
footprint SOIC16W_1.27 (Footprint not found)
part A pins: 2 OFFSET NULL (in), 3 -IN (in), 5 +IN (in), 6 -VS (power), 11 OFFSET NULL (in), 12 OUT (out), 13 +VS (power)
part B pins: 1 NC, 4 NC, 7 NC, 8 NC, 9 NC, 10 NC, 14 NC, 15 NC, 16 NC
